# Altium footprint library laihi.PcbLib: 222 footprints (part 9 of 14)
Each footprint in its own frame and in the unit in brackets; x right, y up, seen from the top. Pads: shape width x height; smd on the part's side, far side on the other; paste and mask are expansions set on the pad; w line width, h text height; cw(c..) or ccw(c..) is an arc to the next point about the centre after c.
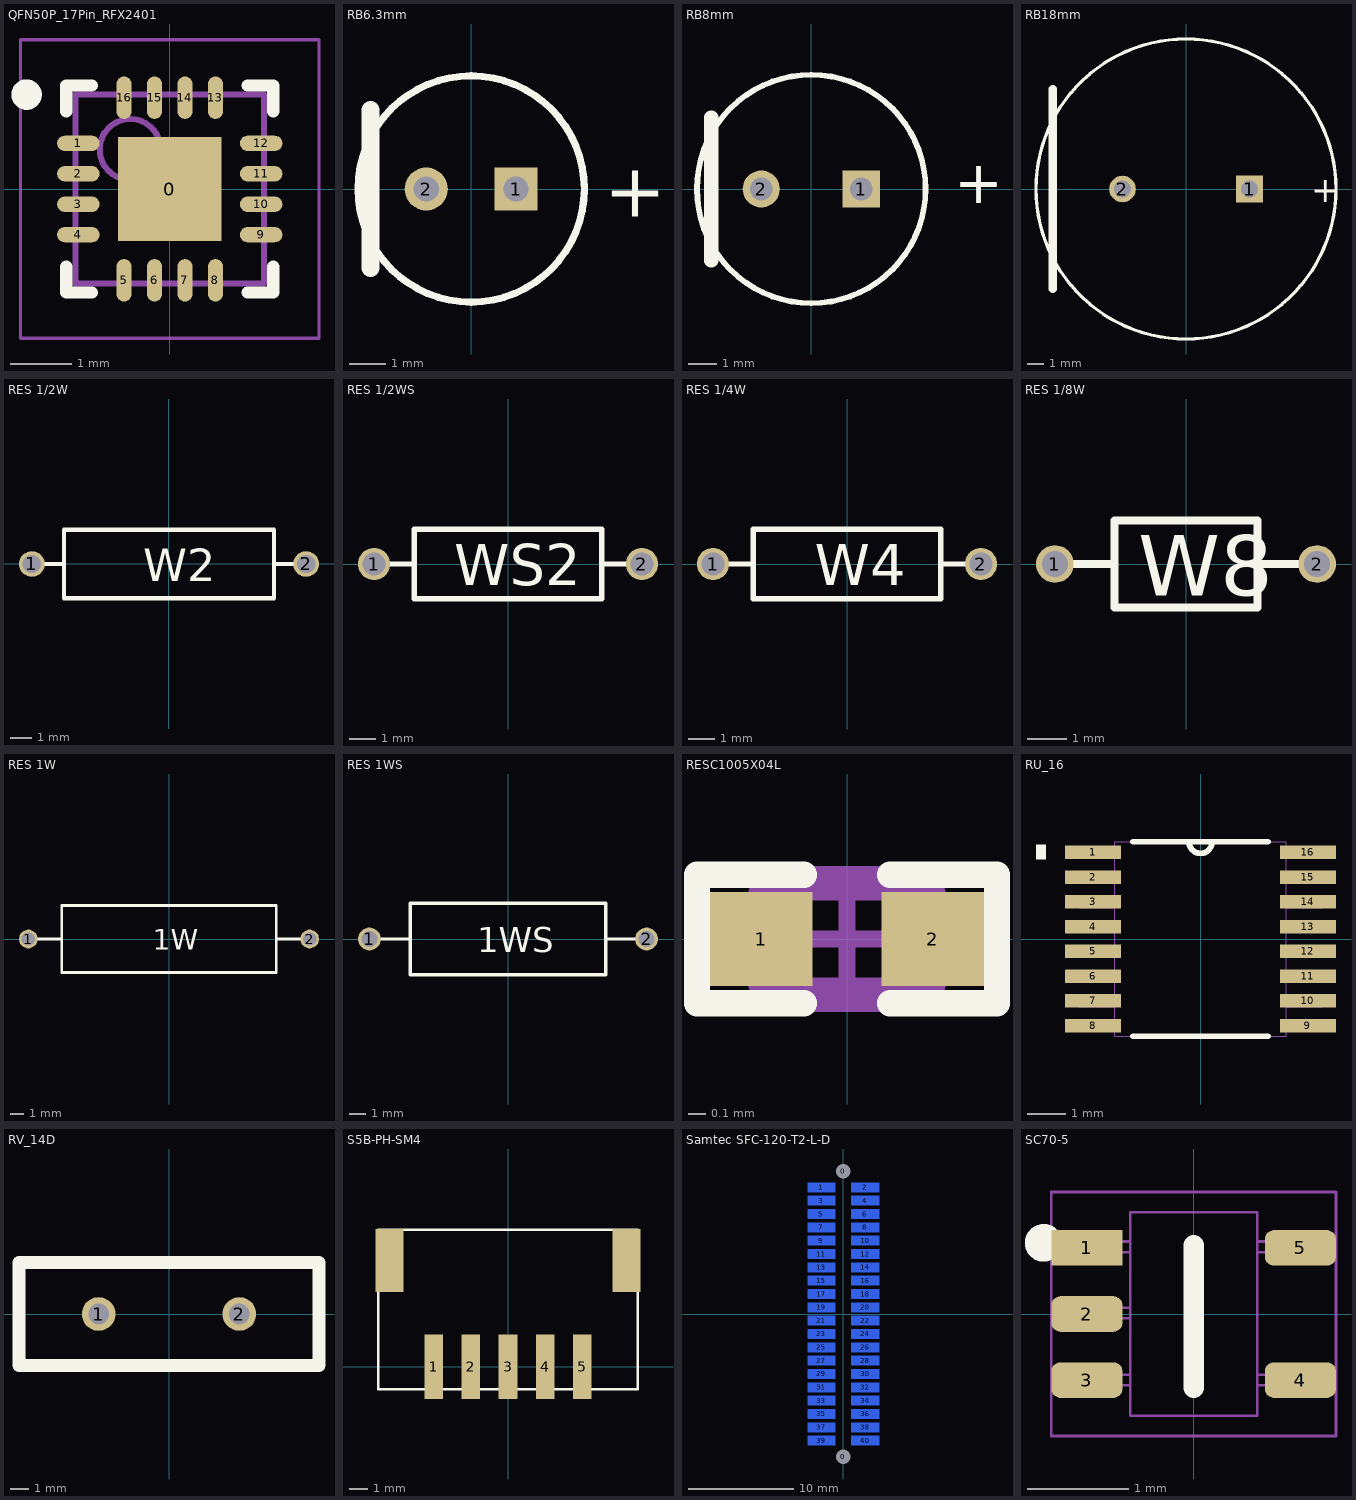
[diagram p8: the footprints below, top view; thin cyan lines are the x and y axes]

## QFN50P_17Pin_RFX2401 [mm] "QFN, 16-Leads, Body 3.00x3.00mm, Pitch 0.50mm, Thermal Pad 1.70x1.70mm, IPC Low Density"
height 0.55
pads (17):
  rect 1.7x1.7 smd: 0(0,0)
  oval 0.7x0.25 smd: 1(-1.5,0.75) 2(-1.5,0.25) 3(-1.5,-0.25) 4(-1.5,-0.75) 9(1.5,-0.75) 10(1.5,-0.25) 11(1.5,0.25) 12(1.5,0.75)
  oval 0.25x0.7 smd: 5(-0.75,-1.5) 6(-0.25,-1.5) 7(0.25,-1.5) 8(0.75,-1.5) 13(0.75,1.5) 14(0.25,1.5) 15(-0.25,1.5) 16(-0.75,1.5)
Top Overlay:
  circle w0.25: c-2.35,1.55 r0.125
  lines w0.2: -1.7,-1.275 -1.7,-1.7 -1.275,-1.7 ; -1.7,1.275 -1.7,1.7 -1.275,1.7 ; 1.275,-1.7 1.7,-1.7 1.7,-1.275 ; 1.275,1.7 1.7,1.7 1.7,1.275
Mechanical 13:
  circle w0.1: c-0.65,0.65 r0.5
  lines w0.1: -1.55,-1.55 1.55,-1.55 1.55,1.55 -1.55,1.55 -1.55,-1.55
Mechanical 15:
  lines w0.05: -2.45,-2.45 2.45,-2.45 2.45,2.45 -2.45,2.45 -2.45,-2.45
  lines w0.1: -0.5,0 0.5,0 ; 0,-0.5 0,0.5
3D body "QFN50P_17Pin_RFX2401.step": height 0.55, standoff 0, extent -1.57,-1.57 1.57,1.57

## RB6.3mm [mm] "Polarized Capacitor (Radial); 2 Leads"
height 11
pads (2):
  rect 1.2x1.2 hole 0.7: 1(1.25,0)
  round 1.2 hole 0.7: 2(-1.25,0)
Top Overlay:
  circle w0.2: c0,0 r3.15
  lines w0.5: -2.8,-2.2 -2.8,2.2
  text "+" at 3.7,-0.775 h1.5

## RB8mm [mm] "Polarized Capacitor (Radial); 2 Leads"
height 16
pads (2):
  rect 1.3x1.3 hole 0.8: 1(1.75,0)
  round 1.3 hole 0.8: 2(-1.75,0)
Top Overlay:
  circle w0.2: c0,0 r4
  lines w0.5: -3.5,-2.5 -3.5,2.5
  text "+" at 5,-0.5 h1.5

## RB18mm [mm] "Polarized Capacitor (Radial); 2 Leads"
height 32
pads (2):
  rect 1.6x1.6 hole 1 mask+0.15: 1(3.81,0)
  round 1.6 hole 1 mask+0.15: 2(-3.81,0)
Top Overlay:
  circle w0.2: c0,0 r9
  lines w0.5: -8,-6 -8,6
  text "+" at 7.5,-0.8 h1.5

## RES 1/2W [mm] "RES Thru-Hole; 2 Leads; 350V"
height 3.6
pads (2):
  round 1.2 hole 0.85: 1(-6.4,0) 2(6.4,0)
Top Overlay:
  lines w0.2: -5.916,0 -4.9,0 ; 4.9,0 5.916,0 ; -4.9,-1.6 4.9,-1.6 4.9,1.6 -4.9,1.6 -4.9,-1.6
  text "W2" at -1.2,-0.8 h1.52

## RES 1/2WS [mm] "RES Thru-Hole; 2 Leads; 250V"
height 2.5
pads (2):
  round 1.2 hole 0.85: 1(-5,0) 2(5,0)
Top Overlay:
  lines w0.2: -4.516,0 -3.5,0 ; 3.5,0 4.516,0 ; -3.5,-1.3 3.5,-1.3 3.5,1.3 -3.5,1.3 -3.5,-1.3
  text "WS2" at -2,-0.8 h1.52

## RES 1/4W [mm] "RES Thru-Hole; 2 Leads; 250V"
height 2.5
pads (2):
  round 1.2 hole 0.85: 1(-5,0) 2(5,0)
Top Overlay:
  lines w0.2: -4.516,0 -3.5,0 ; 3.5,0 4.516,0 ; -3.5,-1.3 3.5,-1.3 3.5,1.3 -3.5,1.3 -3.5,-1.3
  text "W4" at -1.2,-0.8 h1.52

## RES 1/8W [mm] "RES Thru-Hole; 2 Leads; 200V 6.6mm"
height 2.2
pads (2):
  round 0.95 hole 0.65: 1(-3.3,0) 2(3.3,0)
Top Overlay:
  lines w0.2: -2.816,0 -1.8,0 ; 1.8,0 2.816,0 ; -1.8,-1.1 1.8,-1.1 1.8,1.1 -1.8,1.1 -1.8,-1.1
  text "W8" at -1.2,-0.8 h1.52

## RES 1W [mm] "RES Thru-Hole; 2 Leads; 500V"
height 5.6
pads (2):
  round 1.4 hole 1: 1(-10.5,0) 2(10.5,0)
Top Overlay:
  lines w0.2: -10.016,0 -8,0 ; 8,0 10.5,0 ; -8,-2.5 -8,2.5 8,2.5 8,-2.5 -8,-2.5
  text "1W" at -1.2,-0.8 h1.52

## RES 1WS [mm] "RES Thru-Hole; 2 Leads; 500V"
height 4.6
pads (2):
  round 1.4 hole 1: 1(-8.5,0) 2(8.5,0)
Top Overlay:
  lines w0.2: -8.016,0 -6,0 ; 6,0 8.5,0 ; -6,-2.2 6,-2.2 6,2.2 -6,2.2 -6,-2.2
  text "1WS" at -1.9,-0.8 h1.52

## RESC1005X04L [mm]
pads (2):
  rect 0.6x0.55 smd: 1(-0.5,0) 2(0.5,0)
Top Overlay:
  lines w0.152: -0.25,-0.375 -0.875,-0.375 -0.875,0.375 -0.25,0.375 ; 0.25,-0.375 0.875,-0.375 0.875,0.375 0.25,0.375
Mechanical 13:
  lines w0.1: -0.525,-0.275 0.525,-0.275 0.525,0.275 -0.525,0.275 -0.525,-0.275
Mechanical 15:
  lines w0.1: -0.275,0 0.275,0 ; 0,-0.275 0,0.275 ; -0.875,-0.375 -0.875,0.375 0.875,0.375 0.875,-0.375 -0.875,-0.375
3D body "User Library-res0402-1.step": height 0.3, standoff 0, extent -0.5,-0.25 0.5,0.25

## RU_16 [mil]
height 78.74
pads (16):
  rect 58x14 smd: 1(-111,89.57) 2(-111,63.98) 3(-111,38.39) 4(-111,12.8) 5(-111,-12.8) 6(-111,-38.39) 7(-111,-63.98) 8(-111,-89.57) 9(111,-89.57) 10(111,-63.98) 11(111,-38.39) 12(111,-12.8) 13(111,12.8) 14(111,38.39) 15(111,63.98) 16(111,89.57)
Top Overlay:
  region: -170,97.5 -160,97.5 -160,82.5 -170,82.5
  lines w6: -69.61,-100.5 69.61,-100.5 ; -69.61,100.5 69.61,100.5 ; -12,100.5 ccw(c0,100.5) 12,100.5
Mechanical 1:
  lines w0: -12,100.5 ccw(c0,100.5) 12,100.5 ; -126,-95.57 -88.5,-95.57 -88.5,-83.57 -126,-83.57 -126,-95.57 ; -126,-69.98 -88.5,-69.98 -88.5,-57.98 -126,-57.98 -126,-69.98 ; -126,-44.39 -88.5,-44.39 -88.5,-32.39 -126,-32.39 -126,-44.39 ; -126,-18.8 -88.5,-18.8 -88.5,-6.8 -126,-6.8 -126,-18.8 ; -126,6.8 -88.5,6.8 -88.5,18.8 -126,18.8 -126,6.8 ; -126,32.39 -88.5,32.39 -88.5,44.39 -126,44.39 -126,32.39 ; -126,57.98 -88.5,57.98 -88.5,69.98 -126,69.98 -126,57.98 ; -126,83.57 -88.5,83.57 -88.5,95.57 -126,95.57 -126,83.57 ; -88.5,-100.5 -88.5,100.5 88.5,100.5 88.5,-100.5 -88.5,-100.5 ; 88.5,-95.57 126,-95.57 126,-83.57 88.5,-83.57 88.5,-95.57 ; 88.5,-69.98 126,-69.98 126,-57.98 88.5,-57.98 88.5,-69.98 ; 88.5,-44.39 126,-44.39 126,-32.39 88.5,-32.39 88.5,-44.39 ; 88.5,-18.8 126,-18.8 126,-6.8 88.5,-6.8 88.5,-18.8 ; 88.5,6.8 126,6.8 126,18.8 88.5,18.8 88.5,6.8 ; 88.5,32.39 126,32.39 126,44.39 88.5,44.39 88.5,32.39 ; 88.5,57.98 126,57.98 126,69.98 88.5,69.98 88.5,57.98 ; 88.5,83.57 126,83.57 126,95.57 88.5,95.57 88.5,83.57

## RV_14D [mm] "Varistor 17mm x 7mm 470V"
height 20
pads (2):
  round 1.8 hole 1.1: 1(-3.75,0) 2(3.75,0)
Top Overlay:
  lines w0.7: -8,-2.75 -8,2.75 8,2.75 8,-2.75 -8,-2.75

## S5B-PH-SM4 [mm] "SMT 5PIN side entry connector male 2.00mm pitch"
height 5.5
pads (7):
  rect 1x3.5 smd: 1(-4,0) 2(-2,0) 3(0,0) 4(2,0) 5(4,0)
  rect 1.5x3.4 smd: ""(-6.4,5.75) ""(6.4,5.75)
Top Overlay:
  lines w0.125: -7,-1.219 7,-1.219 7,7.4 -7,7.4 -7,-1.219
3D body: height 5.5, standoff 0, extent -6.975,-1.2 6.975,9.4

## Samtec SFC-120-T2-L-D [mm]
pads (42):
  round 0.9 hole 1.4 unplated: 0(0,-13.59) 0(0,13.59)
  rect 2.65x0.9 smd far side: 1(-2.08,12.065) 2(2.08,12.065) 3(-2.08,10.795) 4(2.08,10.795) 5(-2.08,9.525) 6(2.08,9.525) 7(-2.08,8.255) 8(2.08,8.255) 9(-2.08,6.985) 10(2.08,6.985) 11(-2.08,5.715) 12(2.08,5.715) 13(-2.08,4.445) 14(2.08,4.445) 15(-2.08,3.175) 16(2.08,3.175) 17(-2.08,1.905) 18(2.08,1.905) 19(-2.08,0.635) 20(2.08,0.635) 21(-2.08,-0.635) 22(2.08,-0.635) 23(-2.08,-1.905) 24(2.08,-1.905) 25(-2.08,-3.175) 26(2.08,-3.175) 27(-2.08,-4.445) 28(2.08,-4.445) 29(-2.08,-5.715) 30(2.08,-5.715) 31(-2.08,-6.985) 32(2.08,-6.985) 33(-2.08,-8.255) 34(2.08,-8.255) 35(-2.08,-9.525) 36(2.08,-9.525) 37(-2.08,-10.795) 38(2.08,-10.795) 39(-2.08,-12.065) 40(2.08,-12.065)
Bottom Overlay:
  lines w0.152: 3.581,-12.776 4.293,-12.776 4.318,-12.751 4.318,-10.312 3.581,-10.312
  lines w0.2: -3.612,-14.25 3.607,-14.25 3.607,14.25 -3.612,14.25 -3.612,-14.25
  text "1" at -4.089,11.836 h0.51
3D body "Samtec SFC-120-T2-X-D-A.step": height 4.69, standoff -1.15, extent -2.12,-14.29 2.134,14.285

## SC70-5 [mm]
pads (5):
  rect 0.7x0.35 smd: 1(-1.05,0.65)
  rrect50% 0.7x0.35 smd: 2(-1.05,0) 3(-1.05,-0.65) 4(1.05,-0.65) 5(1.05,0.65)
Top Overlay:
  circle w0.22: c-1.476,0.7 r0.076
  lines w0.2: 0,-0.725 0,0.675
Mechanical 13:
  lines w0.025: -0.633,-0.041 -0.995,-0.041 -0.995,0.063 -0.633,0.063 ; -0.633,0.609 -0.995,0.609 -0.995,0.713 -0.633,0.713 ; -0.625,-0.7 -0.987,-0.7 -0.987,-0.596 -0.625,-0.596 ; 0.625,-0.7 0.987,-0.7 0.987,-0.596 0.625,-0.596 ; 0.633,0.609 0.995,0.609 0.995,0.713 0.633,0.713 ; -0.625,-1 -0.625,1 0.625,1 0.625,-1 -0.625,-1
Mechanical 15:
  lines w0.025: -1.4,-1.2 -1.4,1.2 1.4,1.2 1.4,-1.2 -1.4,-1.2
3D body "SC70-5.STP": height 1.1, standoff 0, extent -1.1,-1.1 1.1,1.1